# Altium footprint library JEDEC_G.PcbLib: 194 footprints (part 5 of 13)
Each footprint in its own frame and in the unit in brackets; x right, y up, seen from the top. Pads: shape width x height; smd on the part's side, far side on the other; paste and mask are expansions set on the pad; w line width, h text height; cw(c..) or ccw(c..) is an arc to the next point about the centre after c.
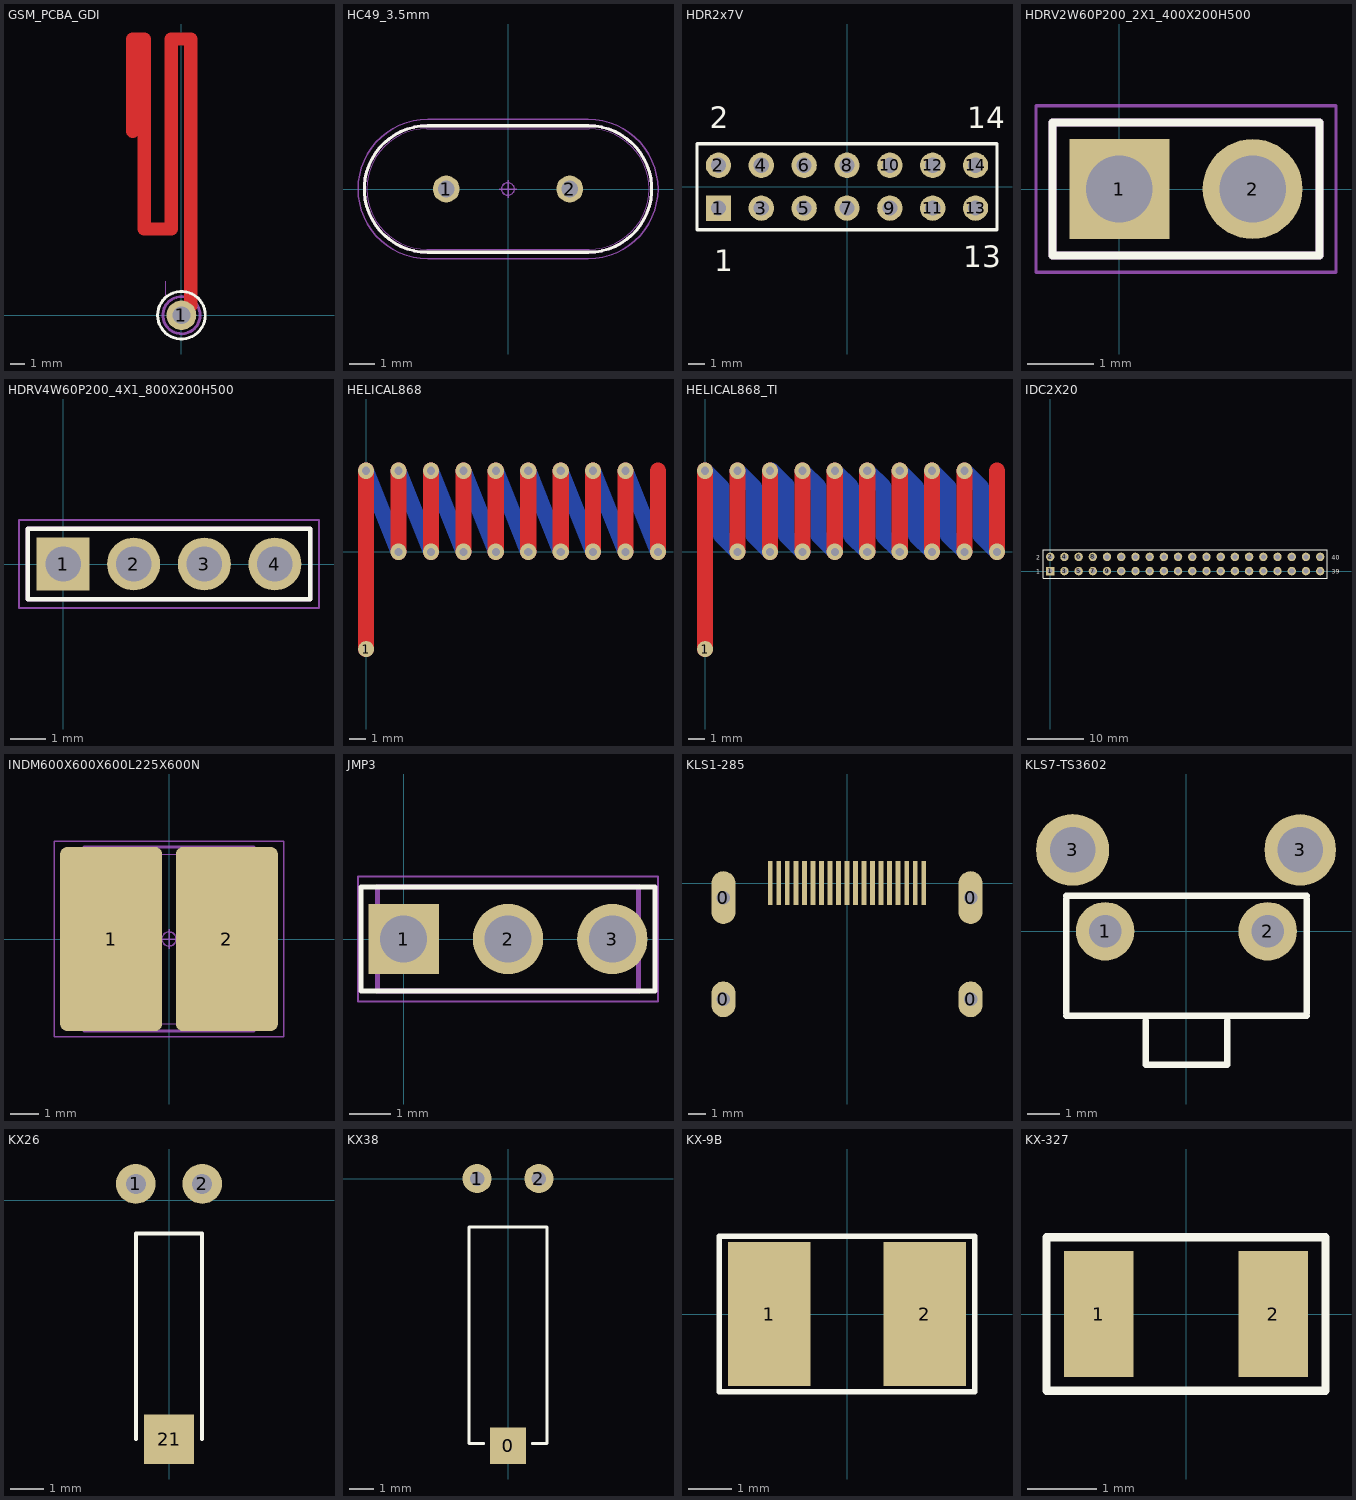
[diagram p4: the footprints below, top view; thin cyan lines are the x and y axes]

## GSM_PCBA_GDI [mm]
pads (1):
  round 2 hole 1.2 mask+0.102: 1(0,0)
Top Layer:
  lines w0.9: -3.275,12.375 -3.275,18.575 -2.5,18.575 -2.5,12.718 -2.6,12.618 ; -2.5,8.918 -2.5,7.932 -2.5,5.8 -0.675,5.8 -0.675,18.575 0.625,18.575 0.625,0.625 0,0 ; -2.5,8.5 -2.5,12.5
Top Overlay:
  circle w0.2: c0,0 r1.6
Mechanical 1:
  lines w0: -1.075,2.3 -1.05,2.275 -1.05,1.075
Mechanical 13:
  circle w0.2: c0,0 r1.25
  circle w0.1: c-0.025,-0.05 r0.645
3D body: height 0.01, standoff 0, extent -1.245,-1.247 1.245,1.248

## HC49_3.5mm [mm] "Crystal, HC-49; 4.88 mm C X 0.43 mm W 11.175 mm L X 4.75 mm T X 3.50 mm H body"
height 3.5
pads (2):
  round 1.06 hole 0.66 paste-1.06: 1(-2.44,0) 2(2.44,0)
Top Overlay:
  lines w0.12: -3.18,-2.5 cw(c-3.18,0) -3.18,2.5 3.18,2.5 cw(c3.18,0) 3.18,-2.5 -3.18,-2.5
Mechanical 11:
  lines w0.12: -3.18,-2.5 cw(c-3.18,0) -3.18,2.5 3.18,2.5 cw(c3.18,0) 3.18,-2.5 -3.18,-2.5
Mechanical 12:
  circle w0.025: c2.44,0 r0.23
  circle w0.025: c-2.44,0 r0.23
  lines w0.025: -3.213,-2.375 cw(c-3.213,0) -3.213,2.375 3.213,2.375 cw(c3.213,0) 3.213,-2.375 -3.213,-2.375
Mechanical 15:
  circle w0.05: c0,0 r0.25
  lines w0.05: -0.35,0 0.35,0 ; 0,-0.35 0,0.35 ; -3.18,-2.75 cw(c-3.18,0) -3.18,2.75 3.18,2.75 cw(c3.18,0) 3.18,-2.75 -3.18,-2.75
Mechanical 16:
  text ".Designator" at 0,0 h1.2
3D body "XTAL_HC49P488W43L1117T475H350.STEP": height 3.5, standoff -2, extent -5.587,-2.375 5.587,2.375

## HDR2x7V [mm]
pads (14):
  rect 1.5x1.5 hole 0.9: 1(-7.62,-1.27)
  round 1.5 hole 0.9: 2(-7.62,1.27) 3(-5.08,-1.27) 4(-5.08,1.27) 5(-2.54,-1.27) 6(-2.54,1.27) 7(0,-1.27) 8(0,1.27) 9(2.54,-1.27) 10(2.54,1.27) 11(5.08,-1.27) 12(5.08,1.27) 13(7.62,-1.27) 14(7.62,1.27)
Top Overlay:
  lines w0.2: -8.89,-2.54 8.89,-2.54 8.89,2.54 -8.89,2.54 -8.89,-2.54
  text "13" at 6.88,-4.77 h1.27
  text "14" at 7.13,3.48 h1.27
  text "1" at -7.87,-5.02 h1.27
  text "2" at -8.12,3.48 h1.27
3D body "DS1021-2x7SF11.stp": height 8.6, standoff -3, extent -8.89,-2.5 8.89,2.5

## HDRV2W60P200_2X1_400X200H500 [mm] "Header, Vertical, 2.00 mm pitch; 0.60 mm lead width, 2 pins, 1 row, 2 pins per row, 4.00 mm L X 2.00 mm W X 5.00 mm H body"
height 5
pads (2):
  rect 1.5x1.5 hole 1 paste-1.5: 1(0,0)
  round 1.5 hole 1 paste-1.5: 2(2,0)
Top Overlay:
  lines w0.12: -1,-1 3,-1 3,1 -1,1 -1,-1
Mechanical 11:
  lines w0.12: -1,-1 3,-1 3,1 -1,1 -1,-1
Mechanical 12:
  lines w0.025: -1,-1 3,-1 3,1 -1,1 -1,-1 ; -0.3,-0.3 0.3,-0.3 0.3,0.3 -0.3,0.3 -0.3,-0.3 ; 1.7,-0.3 2.3,-0.3 2.3,0.3 1.7,0.3 1.7,-0.3
Mechanical 15:
  circle w0.05: c0,0 r0.25
  lines w0.05: -0.35,0 0.35,0 ; 0,-0.35 0,0.35 ; -1.25,-1.25 3.25,-1.25 3.25,1.25 -1.25,1.25 -1.25,-1.25
3D body "HDRV2W60P200_2X1_400X200H500.STEP": height 5, standoff -2.3, extent -1,-1 3,1

## HDRV4W60P200_4X1_800X200H500 [mm] "Header, Vertical, 2.00 mm pitch; 0.60 mm lead width, 4 pins, 1 row, 4 pins per row, 8.00 mm L X 2.00 mm W X 5.00 mm H body"
height 5
pads (4):
  rect 1.5x1.5 hole 1 paste-1.5: 1(0,0)
  round 1.5 hole 1 paste-1.5: 2(2,0) 3(4,0) 4(6,0)
Top Overlay:
  lines w0.12: -1,-1 7,-1 7,1 -1,1 -1,-1
Mechanical 11:
  lines w0.12: -1,-1 7,-1 7,1 -1,1 -1,-1
Mechanical 12:
  lines w0.025: -1,-1 7,-1 7,1 -1,1 -1,-1 ; -0.3,-0.3 0.3,-0.3 0.3,0.3 -0.3,0.3 -0.3,-0.3 ; 1.7,-0.3 2.3,-0.3 2.3,0.3 1.7,0.3 1.7,-0.3 ; 3.7,-0.3 4.3,-0.3 4.3,0.3 3.7,0.3 3.7,-0.3 ; 5.7,-0.3 6.3,-0.3 6.3,0.3 5.7,0.3 5.7,-0.3
Mechanical 15:
  circle w0.05: c0,0 r0.25
  lines w0.05: -0.35,0 0.35,0 ; 0,-0.35 0,0.35 ; -1.25,-1.25 7.25,-1.25 7.25,1.25 -1.25,1.25 -1.25,-1.25
Mechanical 16:
  text ".Designator" at 0,0 h1.2
3D body "HDRV4W60P200_4X1_800X200H500.STEP": height 5, standoff -2.3, extent -1,-1 7,1

## HELICAL868 [mm]
pads (1):
  round 1 smd: 1(0,-6)
via 18,0 diameter 1 hole 0.5
via 16,0 diameter 1 hole 0.5
via 14,0 diameter 1 hole 0.5
via 12,0 diameter 1 hole 0.5
via 10,0 diameter 1 hole 0.5
via 8,0 diameter 1 hole 0.5
via 6,0 diameter 1 hole 0.5
via 4,0 diameter 1 hole 0.5
via 2,0 diameter 1 hole 0.5
via 16,5 diameter 1 hole 0.5
via 14,5 diameter 1 hole 0.5
via 12,5 diameter 1 hole 0.5
via 10,5 diameter 1 hole 0.5
via 8,5 diameter 1 hole 0.5
via 6,5 diameter 1 hole 0.5
via 4,5 diameter 1 hole 0.5
via 2,5 diameter 1 hole 0.5
via 0,5 diameter 1 hole 0.5
Top Layer:
  lines w1: 0,-6 0,5 ; 2,0 2,5 ; 4,0 4,5 ; 6,0 6,5 ; 8,0 8,5 ; 10,0 10,5 ; 12,0 12,5 ; 14,0 14,5 ; 16,0 16,5 ; 18,0 18,5
Bottom Layer:
  lines w1: 0,5 2,0 ; 2,5 4,0 ; 4,5 6,0 ; 6,5 8,0 ; 8,5 10,0 ; 10,5 12,0 ; 12,5 14,0 ; 14,5 16,0 ; 16,5 18,0

## HELICAL868_TI [mm]
pads (1):
  round 1 smd: 1(0,-6)
via 0,5 diameter 1 hole 0.5
via 2,5 diameter 1 hole 0.5
via 4,5 diameter 1 hole 0.5
via 6,5 diameter 1 hole 0.5
via 8,5 diameter 1 hole 0.5
via 10,5 diameter 1 hole 0.5
via 12,5 diameter 1 hole 0.5
via 14,5 diameter 1 hole 0.5
via 16,5 diameter 1 hole 0.5
via 2,0 diameter 1 hole 0.5
via 4,0 diameter 1 hole 0.5
via 6,0 diameter 1 hole 0.5
via 8,0 diameter 1 hole 0.5
via 10,0 diameter 1 hole 0.5
via 12,0 diameter 1 hole 0.5
via 14,0 diameter 1 hole 0.5
via 16,0 diameter 1 hole 0.5
via 18,0 diameter 1 hole 0.5
Top Layer:
  lines w1: 0,-6 0,5 ; 2,0 2,5 ; 4,0 4,5 ; 6,0 6,5 ; 8,0 8,5 ; 10,0 10,5 ; 12,0 12,5 ; 14,0 14,5 ; 16,0 16,5 ; 18,0 18,5
Bottom Layer:
  lines w1: 0,5 1,4 1,1 2,0 ; 4,0 3,1 3,4 2,5 ; 4,5 4.1,5 5,4.1 5,1 6,0 ; 6,5 7,4 7,1 8,0 ; 8,5 9,4 9,1 10,0 ; 10,5 11,4 11,1 12,0 ; 14,0 13,1 13,4 12,5 ; 14,5 15,4 15,1 16,0 ; 18,0 17,1 17,4 16,5 ; 2,5 2,5 ; 12,5 12,5 ; 16,5 16,5

## IDC2X20 [mm] "Connector; Header; 20x2 Position"
height 2.38
pads (40):
  rect 1.5x1.5 hole 0.9: 1(0,0)
  round 1.5 hole 0.9: 2(0,2.54) 3(2.54,0) 4(2.54,2.54) 5(5.08,0) 6(5.08,2.54) 7(7.62,0) 8(7.62,2.54) 9(10.16,0) 10(10.16,2.54) 11(12.7,0) 12(12.7,2.54) 13(15.24,0) 14(15.24,2.54) 15(17.78,0) 16(17.78,2.54) 17(20.32,0) 18(20.32,2.54) 19(22.86,0) 20(22.86,2.54) 21(25.4,0) 22(25.4,2.54) 23(27.94,0) 24(27.94,2.54) 25(30.48,0) 26(30.48,2.54) 27(33.02,0) 28(33.02,2.54) 29(35.56,0) 30(35.56,2.54) 31(38.1,0) 32(38.1,2.54) 33(40.64,0) 34(40.64,2.54) 35(43.18,0) 36(43.18,2.54) 37(45.72,0) 38(45.72,2.54) 39(48.26,0) 40(48.26,2.54)
Top Overlay:
  lines w0.2: -1.27,-1.27 -1.27,3.81 49.53,3.81 49.53,-1.27 -1.27,-1.27
  text "39" at 50.292,-0.508 h0.8
  text "40" at 50.292,2.032 h0.8
  text "2" at -2.54,2.032 h0.8
  text "1" at -2.54,-0.508 h0.8
3D body "DS1013-40S (IDC-40MS CONNFLY).step": height 9, standoff -3.6, extent -5.17,-3.23 53.43,5.67

## INDM600X600X600L225X600N [mm] "Inductor, Molded Body; 5.50 mm L X 6.00 mm W X 6.00 mm H body"
height 6
pads (2):
  rrect14% 3.61x6.51 smd: 1(-2.045,0) 2(2.045,0)
Mechanical 11:
  lines w0.12: -3,-3.25 3,-3.25 3,3.25 -3,3.25 -3,-3.25
Mechanical 12:
  lines w0.025: -3,-3 -3,3 -0.75,3 -0.75,-3 -3,-3 ; -2.75,-3 2.75,-3 2.75,3 -2.75,3 -2.75,-3 ; 0.75,-3 3,-3 3,3 0.75,3 0.75,-3
Mechanical 15:
  circle w0.05: c0,0 r0.25
  lines w0.05: -0.35,0 0.35,0 ; 0,-0.35 0,0.35 ; -4.05,-3.455 -4.05,3.455 4.05,3.455 4.05,-3.455 -4.05,-3.455
Mechanical 16:
  text ".Designator" at 0,0 h1.2
3D body "INDM600X600X600L225X600.STEP": height 6, standoff 0, extent -3,-3 3,3

## JMP3 [mm] "Header, Vertical, 2.54 mm pitch; 0.70 mm lead width, 3 pins, 1 row, 3 pins per row, 6.35 mm L X 2.54 mm W X 7.54 mm H body"
height 7.54
pads (3):
  rect 1.71x1.71 hole 1.14 paste-1.71: 1(0,0)
  round 1.71 hole 1.14 paste-1.71: 2(2.54,0) 3(5.08,0)
Top Overlay:
  lines w0.12: -1.04,-1.27 -1.04,1.27 6.12,1.27 6.12,-1.27 -1.04,-1.27
Mechanical 11:
  lines w0.12: -0.64,-1.27 -0.64,1.27 5.72,1.27 5.72,-1.27 -0.64,-1.27
Mechanical 12:
  lines w0.025: -0.635,-1.27 -0.635,1.27 5.715,1.27 5.715,-1.27 -0.635,-1.27 ; -0.35,-0.35 -0.35,0.35 0.35,0.35 0.35,-0.35 -0.35,-0.35 ; 2.19,-0.35 2.19,0.35 2.89,0.35 2.89,-0.35 2.19,-0.35 ; 4.73,-0.35 4.73,0.35 5.43,0.35 5.43,-0.35 4.73,-0.35
Mechanical 15:
  circle w0.05: c0,0 r0.25
  lines w0.05: -0.35,0 0.35,0 ; 0,-0.35 0,0.35 ; -1.11,-1.52 -1.11,1.52 6.19,1.52 6.19,-1.52 -1.11,-1.52
3D body "pin header 1x3 and jumper.stp": height 9, standoff -2.99, extent -1.27,-1.27 6.35,1.27

## KLS1-285 [mm] "HDMI PCB connector"
pads (23):
  oval 1.4x2.1 hole 0.8: 0(-7.25,-6.82) 0(7.25,-6.82)
  oval 1.4x3.1 hole 0.8: 0(-7.25,-0.86) 0(7.25,-0.86)
  rect 0.28x2.6 smd: 1(4.5,0) 2(4,0) 3(3.5,0) 4(3,0) 5(2.5,0) 6(2,0) 7(1.5,0) 8(1,0) 9(0.5,0) 10(0,0) 11(-0.5,0) 12(-1,0) 13(-1.5,0) 14(-2,0) 15(-2.5,0) 16(-3,0) 17(-3.5,0) 18(-4,0) 19(-4.5,0)
3D body "molex_0471510001.STEP": height 6.23, standoff -2.15, extent -7.5,-11.5 7.5,0.65

## KLS7-TS3602 [mm] "miniature switch"
pads (4):
  round 1.8 hole 1: 1(-2.5,0) 2(2.5,0)
  oval 2.25x2.2 hole 1.4: 3(-3.5,2.5)
  round 2.2 hole 1.4: 3(3.5,2.5)
Top Overlay:
  lines w0.2: -3.7,-2.6 3.7,-2.6 ; -3.7,-2.5 -3.7,1 ; -3.7,1.1 3.7,1.1 ; -1.25,-2.75 -1.25,-4.1 1.25,-4.1 1.25,-2.75 ; 3.7,-2.5 3.7,1
3D body "KLS7-TS3602.STEP": height 4.4, standoff -1.4, extent -3.7,-3.975 3.6,3.75

## KX26 [mm] "clock crystal, 2*6 mm"
pads (3):
  round 1.2 hole 0.6: 1(-1,0.5) 2(1,0.5)
  rect 1.5x1.5 smd: 21(0,-7.2)
Top Overlay:
  lines w0.12: -1,-7.2 -1,-1 1,-1 1,-7.2
3D body: height 0.99, standoff -1, extent -1,-7.2 0.996,-1

## KX38 [mm] "clock crystal, 2*6 mm"
pads (3):
  rect 1.5x1.5 smd: 0(0,-11)
  round 1.2 hole 0.6: 1(-1.27,0) 2(1.27,0)
Top Overlay:
  lines w0.12: -1,-10.9 -1.6,-10.9 -1.6,-2 1.6,-2 1.6,-10.9 1,-10.9
3D body "KX38.STEP": height 3.1, standoff -0.35, extent -1.5,-10.84 1.5,0.176

## KX-9B [mil]
pads (2):
  rect 74x130 smd: 1(-70,0) 2(70,0)
Top Overlay:
  lines w5: -115,-70 -115,70 115,70 115,-70 -115,-70
3D body "CERAMIC SMD CRYSTAL_AMB3B.stp": height 43.31, standoff -1.97, extent -98.42,-62.99 98.43,63

## KX-327 [mm]
pads (2):
  rect 1x1.8 smd: 1(-1.25,0) 2(1.25,0)
Top Overlay:
  lines w0.12: -2,-1.1 2,-1.1 2,1.1 -2,1.1 -2,-1.1
3D body "KX-327NHT.step": height 0.71, standoff 0, extent -1.6,-0.75 1.6,0.75